# Altium footprint library Inverter_2kW.PcbLib: 61 footprints (part 2 of 4)
Each footprint in its own frame and in the unit in brackets; x right, y up, seen from the top. Pads: shape width x height; smd on the part's side, far side on the other; paste and mask are expansions set on the pad; w line width, h text height; cw(c..) or ccw(c..) is an arc to the next point about the centre after c.
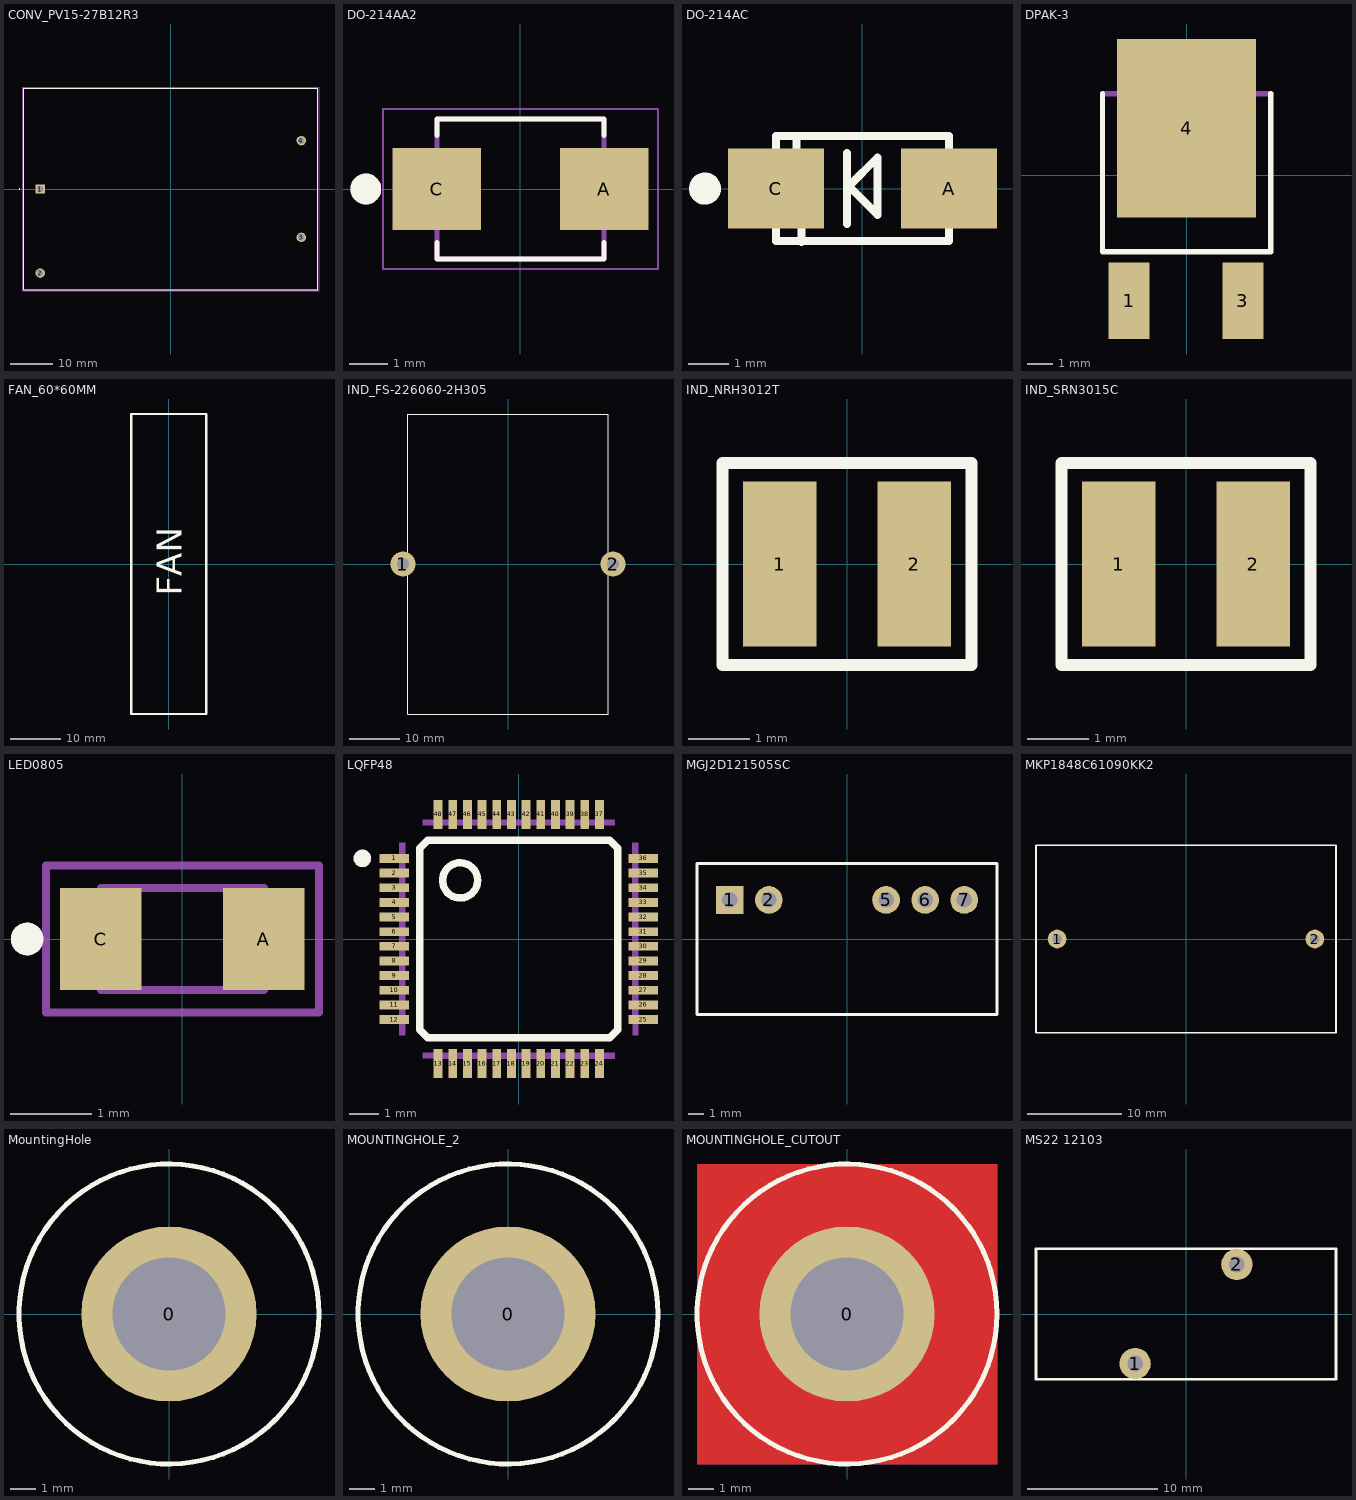
[diagram p1: the footprints below, top view; thin cyan lines are the x and y axes]

## CONV_PV15-27B12R3 [mm]
pads (4):
  rect 2.25x2.25 hole 1.5: 1(-31.045,0)
  round 2.25 hole 1.5: 2(-31.045,-20) 3(31.045,-11.5) 4(31.045,11.5)
Top Overlay:
  circle w0.2: c-36,0 r0.1
  lines w0.127: -35,-24 35,-24 35,24 -35,24 -35,-24
Mechanical 13:
  circle w0.2: c-36,0 r0.1
  lines w0.127: -35,-24 -35,24 35,24 35,-24 -35,-24
Mechanical 15:
  lines w0.05: -35.25,-24.25 -35.25,24.25 35.25,24.25 35.25,-24.25 -35.25,-24.25
3D body "step_temp.STEP": height 23.5, standoff -8, extent -35,-24 35,24

## DO-214AA2 [mm]
pads (2):
  rect 2.28x2.12 smd: A(2.165,0) C(-2.165,0)
Top Overlay:
  circle w0.4: c-4,0 r0.2
  lines w0.127: -2.163,-1.38 -2.163,-1.813 2.163,-1.813 2.163,-1.38 ; -2.163,1.38 -2.163,1.813 2.163,1.813 2.163,1.38
Mechanical 13:
  circle w0.4: c-4,0 r0.2
  lines w0.127: -2.163,-1.813 -2.163,1.813 2.163,1.813 2.163,-1.813 -2.163,-1.813
Mechanical 15:
  lines w0.05: -3.555,-2.063 -3.555,2.063 3.555,2.063 3.555,-2.063 -3.555,-2.063
3D body "step_temp.STEP": height 2.46, standoff 0, extent -2.718,-1.778 2.718,1.778

## DO-214AC [mm]
height 46
pads (2):
  rect 2.4x2 smd: A(2.165,0) C(-2.165,0)
Top Overlay:
  circle w0.4: c-3.937,0 r0.2
  lines w0.2: -2.162,-0.88 -2.163,-1.313 2.163,-1.313 2.163,-0.88 ; -2.162,0.88 -2.163,1.313 2.162,1.313 2.162,0.88 ; -1.651,0.88 -1.651,1.313 ; -1.524,-1.33 -1.524,-0.897 ; -0.392,0.116 0.381,-0.657 0.381,0.784 -0.335,0.068 ; -0.381,-0.889 -0.381,0.889
Mechanical 13:
  lines w0.2: -2.163,-1.313 2.163,-1.313 2.162,1.313 -2.163,1.313 -2.163,-1.313
3D body "5A.STEP": height 2.29, standoff 0, extent -2.553,-1.333 2.553,1.334

## DPAK-3 [mil]
height 531.5
pads (3):
  rect 63x118 smd: 1(-89,-194) 3(87,-194)
  rect 214.63x275.59 smd: 4(0,72.94)
Top Overlay:
  lines w8: -129.92,125.98 -129.92,-118.11 129.92,-118.11 129.92,125.98
Mechanical 13:
  region: 98.43,155.51 98.43,125.98 -98.43,125.98 -98.43,155.51 -64.96,177.17 64.96,177.17
  lines w8: -129.92,125.98 129.92,125.98
  text "4" at -13.02,72.63 h24.04
3D body "MJD122.STEP": height 94, standoff -5, extent -127.95,-209.99 127.95,180.01

## FAN_60*60MM [mm] "CAPACITOR SMD 0805"
height 0.94
Top Overlay:
  lines w0.5: -7.5,-30 -7.5,30 7.5,30 7.5,-30 -7.5,-30
  text "FAN" at 2.65,-6.4 h5
3D body: height 61, standoff 1, extent -7.5,-29.972 7.5,29.972

## IND_FS-226060-2H305 [mm]
pads (2):
  round 5 hole 2.4: 1(-21,0) 2(21,0)
Top Overlay:
  lines w0.2: -20,-30 20,-30 20,30 -20,30 -20,-30
3D body: height 60.99, standoff 1.01, extent -20,-30 20,30

## IND_NRH3012T [mm] "CAPACITOR SMD 1210"
height 1.3
pads (2):
  rect 1.2x2.7 smd: 1(-1.1,0) 2(1.1,0)
Top Overlay:
  lines w0.2: -2.032,-1.651 -2.032,1.651 2.032,1.651 2.032,-1.651 -2.032,-1.651
3D body: height 1.9, standoff 0, extent -1.5,-1.5 1.5,1.5

## IND_SRN3015C [mm] "CAPACITOR SMD 1210"
height 1.3
pads (2):
  rect 1.2x2.7 smd: 1(-1.1,0) 2(1.1,0)
Top Overlay:
  lines w0.2: -2.032,-1.651 2.032,-1.651 2.032,1.651 -2.032,1.651 -2.032,-1.651
3D body: height 1.9, standoff 0, extent -1.5,-1.5 1.5,1.5

## LED0805 [mm]
height 13.5
pads (2):
  rect 1x1.25 smd: A(1,0) C(-1,0)
Top Overlay:
  circle w0.2: c-1.905,0 r0.1
Mechanical 13:
  circle w0.2: c-1.905,0 r0.1
  lines w0.1: -1,-0.625 -1,0.625 1,0.625 1,-0.625 -1,-0.625
Mechanical 15:
  lines w0.1: -1.675,-0.9 -1.675,0.9 1.675,0.9 1.675,-0.9 -1.675,-0.9
3D body "7012X1--3DModel-STEP-1.STEP": height 0.73, standoff 0, extent -1.003,-0.622 1.003,0.622

## LQFP48 [mm]
pads (48):
  rect 1x0.3 smd: 1(-4.25,2.75) 2(-4.25,2.25) 3(-4.25,1.75) 4(-4.25,1.25) 5(-4.25,0.75) 6(-4.25,0.25) 7(-4.25,-0.25) 8(-4.25,-0.75) 9(-4.25,-1.25) 10(-4.25,-1.75) 11(-4.25,-2.25) 12(-4.25,-2.75) 25(4.25,-2.75) 26(4.25,-2.25) 27(4.25,-1.75) 28(4.25,-1.25) 29(4.25,-0.75) 30(4.25,-0.25) 31(4.25,0.25) 32(4.25,0.75) 33(4.25,1.25) 34(4.25,1.75) 35(4.25,2.25) 36(4.25,2.75)
  rect 0.3x1 smd: 13(-2.75,-4.25) 14(-2.25,-4.25) 15(-1.75,-4.25) 16(-1.25,-4.25) 17(-0.75,-4.25) 18(-0.25,-4.25) 19(0.25,-4.25) 20(0.75,-4.25) 21(1.25,-4.25) 22(1.75,-4.25) 23(2.25,-4.25) 24(2.75,-4.25) 37(2.75,4.25) 38(2.25,4.25) 39(1.75,4.25) 40(1.25,4.25) 41(0.75,4.25) 42(0.25,4.25) 43(-0.25,4.25) 44(-0.75,4.25) 45(-1.25,4.25) 46(-1.75,4.25) 47(-2.25,4.25) 48(-2.75,4.25)
Top Overlay:
  circle w0.254: c-2,2 r0.6
  circle w0.3: c-5.334,2.75 r0.15
  lines w0.254: -3.375,-3.1 -3.375,3.1 -3.1,3.375 3.1,3.375 3.375,3.1 3.375,-3.1 3.1,-3.375 -3.1,-3.375 -3.375,-3.1
Mechanical 13:
  drawing of 48 lines, arcs and shapes, not listed
3D body "STM32F030C8T6.STEP": height 1.57, standoff -0.03, extent -4.5,-4.5 4.5,4.5

## MGJ2D121505SC [mm]
height 12.5
pads (5):
  rect 1.8x1.8 hole 1: 1(-7.62,2.54)
  round 1.8 hole 1: 2(-5.08,2.54) 5(2.54,2.54) 6(5.08,2.54) 7(7.62,2.54)
Top Overlay:
  lines w0.2: -9.75,-4.9 -9.75,4.9 9.75,4.9 9.75,-4.9 -9.75,-4.9
3D body: height 12.5, standoff 0, extent -9.75,-4.9 9.75,4.9

## MKP1848C61090KK2 [mm]
height 35
pads (2):
  round 2 hole 1: 1(-13.75,0) 2(13.75,0)
Top Overlay:
  lines w0.2: -16,-10 16,-10 16,10 -16,10 -16,-10
3D body: height 35.1, standoff 0.1, extent -16,-10 16,10

## MountingHole [mm]
height 46
pads (1):
  round 7 hole 4.5: 0(0,0)
Top Overlay:
  circle w0.2: c0,0 r6

## MOUNTINGHOLE_2 [mm]
pads (1):
  round 7 hole 4.5: 0(0,0)
Top Overlay:
  circle w0.2: c0,0 r6

## MOUNTINGHOLE_CUTOUT [mm]
height 46
pads (1):
  round 7 hole 4.5: 0(0,0)
Top Layer:
  pour cut-out: -6,6 6,6 6,-6 -6,-6
Bottom Layer:
  pour cut-out: -6,6 6,6 6,-6 -6,-6
Top Overlay:
  circle w0.2: c0,0 r6

## MS22 12103 [mm]
pads (2):
  round 2.4 hole 1.2: 1(-3.9,-3.8) 2(3.9,3.8)
Top Overlay:
  lines w0.2: -11.5,-5 11.5,-5 11.5,5 -11.5,5 -11.5,-5
3D body: height 23.5, standoff 0.5, extent -11.5,-5 11.5,5